# Altium footprint library XU-GENARAL PCB .PcbLib: 1176 footprints (part 21 of 75)
Each footprint in its own frame and in the unit in brackets; x right, y up, seen from the top. Pads: shape width x height; smd on the part's side, far side on the other; paste and mask are expansions set on the pad; w line width, h text height; cw(c..) or ccw(c..) is an arc to the next point about the centre after c.
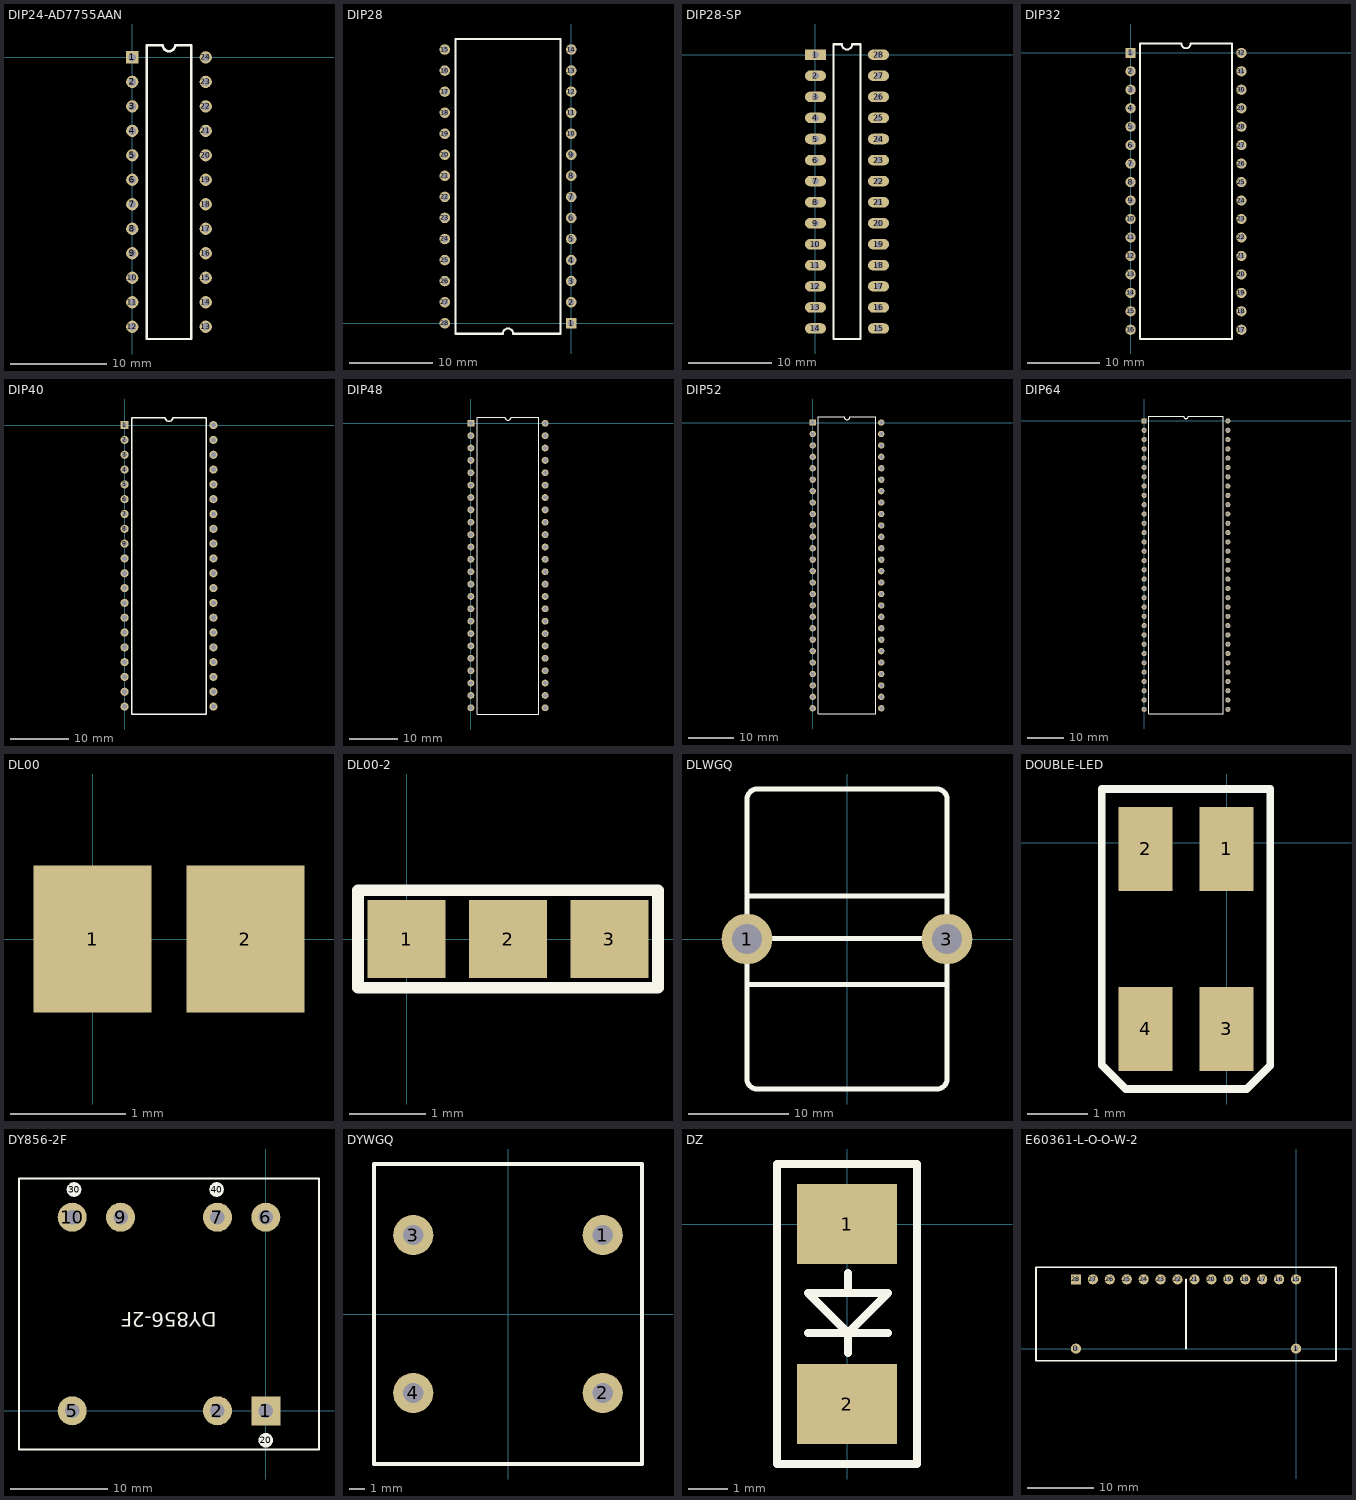
[diagram p20: the footprints below, top view; thin cyan lines are the x and y axes]

## DIP24-AD7755AAN [mil]
pads (24):
  rect 50x50 hole 32: 1(0,0)
  round 50 hole 32: 2(0,-100) 3(0,-200) 4(0,-300) 5(0,-400) 6(0,-500) 7(0,-600) 8(0,-700) 9(0,-800) 10(0,-900) 11(0,-1000) 12(0,-1100) 13(300,-1100) 14(300,-1000) 15(300,-900) 16(300,-800) 17(300,-700) 18(300,-600) 19(300,-500) 20(300,-400) 21(300,-300) 22(300,-200) 23(300,-100) 24(300,0)
Top Overlay:
  lines w10: 60,-1150 60,50 125,50 ccw(c150,50) 175,50 240,50 240,-1150 60,-1150

## DIP28 [mil]
pads (28):
  rect 50x50 hole 32: 1(-0.67,0.16)
  round 50 hole 32: 2(-0.67,100.16) 3(-0.67,200.16) 4(-0.67,300.16) 5(-0.67,400.16) 6(-0.67,500.16) 7(-0.67,600.16) 8(-0.67,700.16) 9(-0.67,800.16) 10(-0.67,900.16) 11(-0.67,1000.16) 12(-0.67,1100.16) 13(-0.67,1200.16) 14(-0.67,1300.16) 15(-600.67,1300.16) 16(-600.67,1200.16) 17(-600.67,1100.16) 18(-600.67,1000.16) 19(-600.67,900.16) 20(-600.67,800.16) 21(-600.67,700.16) 22(-600.67,600.16) 23(-600.67,500.16) 24(-600.67,400.16) 25(-600.67,300.16) 26(-600.67,200.16) 27(-600.67,100.16) 28(-600.67,0.16)
Top Overlay:
  lines w10: -550.67,-49.84 -550.67,1350.16 -50.67,1350.16 -50.67,-49.84 -275.67,-49.84 ccw(c-300.67,-49.84) -325.67,-49.84 -550.67,-49.84

## DIP28-SP [mil]
pads (28):
  rect 100x50 hole 32: 1(0,0)
  oval 100x50 hole 32: 2(0,-100) 3(0,-200) 4(0,-300) 5(0,-400) 6(0,-500) 7(0,-600) 8(0,-700) 9(0,-800) 10(0,-900) 11(0,-1000) 12(0,-1100) 13(0,-1200) 14(0,-1300) 15(300,-1300) 16(300,-1200) 17(300,-1100) 18(300,-1000) 19(300,-900) 20(300,-800) 21(300,-700) 22(300,-600) 23(300,-500) 24(300,-400) 25(300,-300) 26(300,-200) 27(300,-100) 28(300,0)
Top Overlay:
  lines w10: 85,-1350 215,-1350 215,50 175,50 cw(c150,50) 125,50 85,50 85,-1350

## DIP32 [mil]
pads (32):
  rect 55x55 hole 35: 1(0,0)
  round 55 hole 35: 2(0,-100) 3(0,-200) 4(0,-300) 5(0,-400) 6(0,-500) 7(0,-600) 8(0,-700) 9(0,-800) 10(0,-900) 11(0,-1000) 12(0,-1100) 13(0,-1200) 14(0,-1300) 15(0,-1400) 16(0,-1500) 17(600,-1500) 18(600,-1400) 19(600,-1300) 20(600,-1200) 21(600,-1100) 22(600,-1000) 23(600,-900) 24(600,-800) 25(600,-700) 26(600,-600) 27(600,-500) 28(600,-400) 29(600,-300) 30(600,-200) 31(600,-100) 32(600,0)
Top Overlay:
  lines w10: 50,-1550 550,-1550 550,50 325,50 cw(c300,50) 275,50 50,50 50,-1550

## DIP40 [mil]
pads (40):
  rect 55x55 hole 35: 1(0,0)
  round 55 hole 35: 2(0,-100) 3(0,-200) 4(0,-300) 5(0,-400) 6(0,-500) 7(0,-600) 8(0,-700) 9(0,-800) 10(0,-900) 11(0,-1000) 12(0,-1100) 13(0,-1200) 14(0,-1300) 15(0,-1400) 16(0,-1500) 17(0,-1600) 18(0,-1700) 19(0,-1800) 20(0,-1900) 21(600,-1900) 22(600,-1800) 23(600,-1700) 24(600,-1600) 25(600,-1500) 26(600,-1400) 27(600,-1300) 28(600,-1200) 29(600,-1100) 30(600,-1000) 31(600,-900) 32(600,-800) 33(600,-700) 34(600,-600) 35(600,-500) 36(600,-400) 37(600,-300) 38(600,-200) 39(600,-100) 40(600,0)
Top Overlay:
  lines w10: 50,-1950 550,-1950 550,50 325,50 cw(c300,50) 275,50 50,50 50,-1950

## DIP48 [mil]
pads (48):
  rect 55x55 hole 35: 1(0,0)
  round 55 hole 35: 2(0,-100) 3(0,-200) 4(0,-300) 5(0,-400) 6(0,-500) 7(0,-600) 8(0,-700) 9(0,-800) 10(0,-900) 11(0,-1000) 12(0,-1100) 13(0,-1200) 14(0,-1300) 15(0,-1400) 16(0,-1500) 17(0,-1600) 18(0,-1700) 19(0,-1800) 20(0,-1900) 21(0,-2000) 22(0,-2100) 23(0,-2200) 24(0,-2300) 25(600,-2300) 26(600,-2200) 27(600,-2100) 28(600,-2000) 29(600,-1900) 30(600,-1800) 31(600,-1700) 32(600,-1600) 33(600,-1500) 34(600,-1400) 35(600,-1300) 36(600,-1200) 37(600,-1100) 38(600,-1000) 39(600,-900) 40(600,-800) 41(600,-700) 42(600,-600) 43(600,-500) 44(600,-400) 45(600,-300) 46(600,-200) 47(600,-100) 48(600,0)
Top Overlay:
  lines w10: 50,-2350 550,-2350 550,50 325,50 cw(c300,50) 275,50 50,50 50,-2350

## DIP52 [mil]
pads (52):
  rect 55x55 hole 35: 1(0,0)
  round 55 hole 35: 2(0,-100) 3(0,-200) 4(0,-300) 5(0,-400) 6(0,-500) 7(0,-600) 8(0,-700) 9(0,-800) 10(0,-900) 11(0,-1000) 12(0,-1100) 13(0,-1200) 14(0,-1300) 15(0,-1400) 16(0,-1500) 17(0,-1600) 18(0,-1700) 19(0,-1800) 20(0,-1900) 21(0,-2000) 22(0,-2100) 23(0,-2200) 24(0,-2300) 25(0,-2400) 26(0,-2500) 27(600,-2500) 28(600,-2400) 29(600,-2300) 30(600,-2200) 31(600,-2100) 32(600,-2000) 33(600,-1900) 34(600,-1800) 35(600,-1700) 36(600,-1600) 37(600,-1500) 38(600,-1400) 39(600,-1300) 40(600,-1200) 41(600,-1100) 42(600,-1000) 43(600,-900) 44(600,-800) 45(600,-700) 46(600,-600) 47(600,-500) 48(600,-400) 49(600,-300) 50(600,-200) 51(600,-100) 52(600,0)
Top Overlay:
  lines w10: 50,-2550 550,-2550 550,50 325,50 cw(c300,50) 275,50 50,50 50,-2550

## DIP64 [mil]
pads (64):
  rect 55x55 hole 35: 1(0,0)
  round 55 hole 35: 2(0,-100) 3(0,-200) 4(0,-300) 5(0,-400) 6(0,-500) 7(0,-600) 8(0,-700) 9(0,-800) 10(0,-900) 11(0,-1000) 12(0,-1100) 13(0,-1200) 14(0,-1300) 15(0,-1400) 16(0,-1500) 17(0,-1600) 18(0,-1700) 19(0,-1800) 20(0,-1900) 21(0,-2000) 22(0,-2100) 23(0,-2200) 24(0,-2300) 25(0,-2400) 26(0,-2500) 27(0,-2600) 28(0,-2700) 29(0,-2800) 30(0,-2900) 31(0,-3000) 32(0,-3100) 33(900,-3100) 34(900,-3000) 35(900,-2900) 36(900,-2800) 37(900,-2700) 38(900,-2600) 39(900,-2500) 40(900,-2400) 41(900,-2300) 42(900,-2200) 43(900,-2100) 44(900,-2000) 45(900,-1900) 46(900,-1800) 47(900,-1700) 48(900,-1600) 49(900,-1500) 50(900,-1400) 51(900,-1300) 52(900,-1200) 53(900,-1100) 54(900,-1000) 55(900,-900) 56(900,-800) 57(900,-700) 58(900,-600) 59(900,-500) 60(900,-400) 61(900,-300) 62(900,-200) 63(900,-100) 64(900,0)
Top Overlay:
  lines w10: 50,-3150 50,50 425,50 ccw(c450,50) 475,50 850,50 850,-3150 50,-3150

## DL00 [mil]
pads (2):
  rect 40x50 smd: 1(0,0) 2(52,0)

## DL00-2 [mil]
pads (3):
  rect 40x40 smd: 1(0,0) 2(52,0) 3(104,0)
Top Overlay:
  lines w6: -25,-25 129,-25 129,25 -25,25 -25,-25

## DLWGQ [mil]
pads (2):
  round 200 hole 120: 1(-393.7,0) 3(393.7,0)
Top Overlay:
  lines w20: -393.7,-179 393.7,-179 ; -393.7,2 393.7,2 ; -393.7,170 393.7,170 ; -393.7,549 cw(c-353.24,550.09) -354.33,590.55 354.33,590.55 cw(c354.33,551.18) 393.7,551.18 393.7,-551.18 cw(c354.33,-551.18) 354.33,-590.55 -354.33,-590.55 cw(c-354.33,-551.18) -393.7,-551.18 -393.7,551.18

## DOUBLE-LED [mm]
pads (4):
  rect 0.9x1.4 smd: 1(0,-0.1) 2(-1.35,-0.1) 3(0,-3.1) 4(-1.35,-3.1)
Top Overlay:
  lines w0.127: -2.078,-3.705 -2.078,0.9 0.725,0.9 0.725,-3.708 0.333,-4.1 -1.683,-4.1 -2.075,-3.708

## DY856-2F [mm]
pads (10):
  rect 3x3 hole 1.5: 1(0,0)
  round 3 hole 1.5: 2(-5,0) 5(-20,0) 6(0,20) 7(-5,20) 9(-15,20) 10(-20,20)
  round 1.524 on Top Overlay: 20(0,-3.048) 30(-19.812,22.86) 40(-5.08,22.86)
Top Overlay:
  lines w0.254: -25.5,-4 5.5,-4 5.5,24 -25.5,24 -25.5,-4
  text "DY856-2F" at -5.08,10.16 h1.52

## DYWGQ [mm]
pads (4):
  round 2.54 hole 1.27: 1(6,5) 2(6,-5) 3(-6,5) 4(-6,-5)
Top Overlay:
  lines w0.254: -8.5,-9.5 -8.5,9.5 8.5,9.5 8.5,-9.5 -8.5,-9.5

## DZ [mil]
pads (2):
  rect 100x80 smd: 1(0,0) 2(0,-180)
Top Overlay:
  lines w8: -39,-109 41,-109 ; 1,-129 1,-109 ; 1,-49 1,-69 ; 1,-109 -39,-69 1,-69 ; 1,-109 41,-69 1,-69 ; -70,-240 -70,60 70,60 70,-240 -70,-240

## E60361-L-O-O-W-2 [mil]
pads (16):
  round 60 hole 30: 0(-1300,0) 1(0,0) 15(0,409.45) 16(-100,409.45) 17(-200,409.45) 18(-300,409.45) 19(-400,409.45) 20(-500,409.45) 21(-600,409.45) 22(-700,409.45) 23(-800,409.45) 24(-900,409.45) 25(-1000,409.45) 26(-1100,409.45) 27(-1200,409.45)
  rect 60x60 hole 30: 28(-1300,409.45)
Top Overlay:
  lines w10: -650,0 -650,409.45 ; -1535.83,-70.87 -650,-70.87 235.83,-70.87 235.83,480.31 -650,480.31 -1535.83,480.31 -1535.83,-70.87